# Altium footprint library DipComponent.PcbLib: 303 footprints (part 6 of 19)
Each footprint in its own frame and in the unit in brackets; x right, y up, seen from the top. Pads: shape width x height; smd on the part's side, far side on the other; paste and mask are expansions set on the pad; w line width, h text height; cw(c..) or ccw(c..) is an arc to the next point about the centre after c.
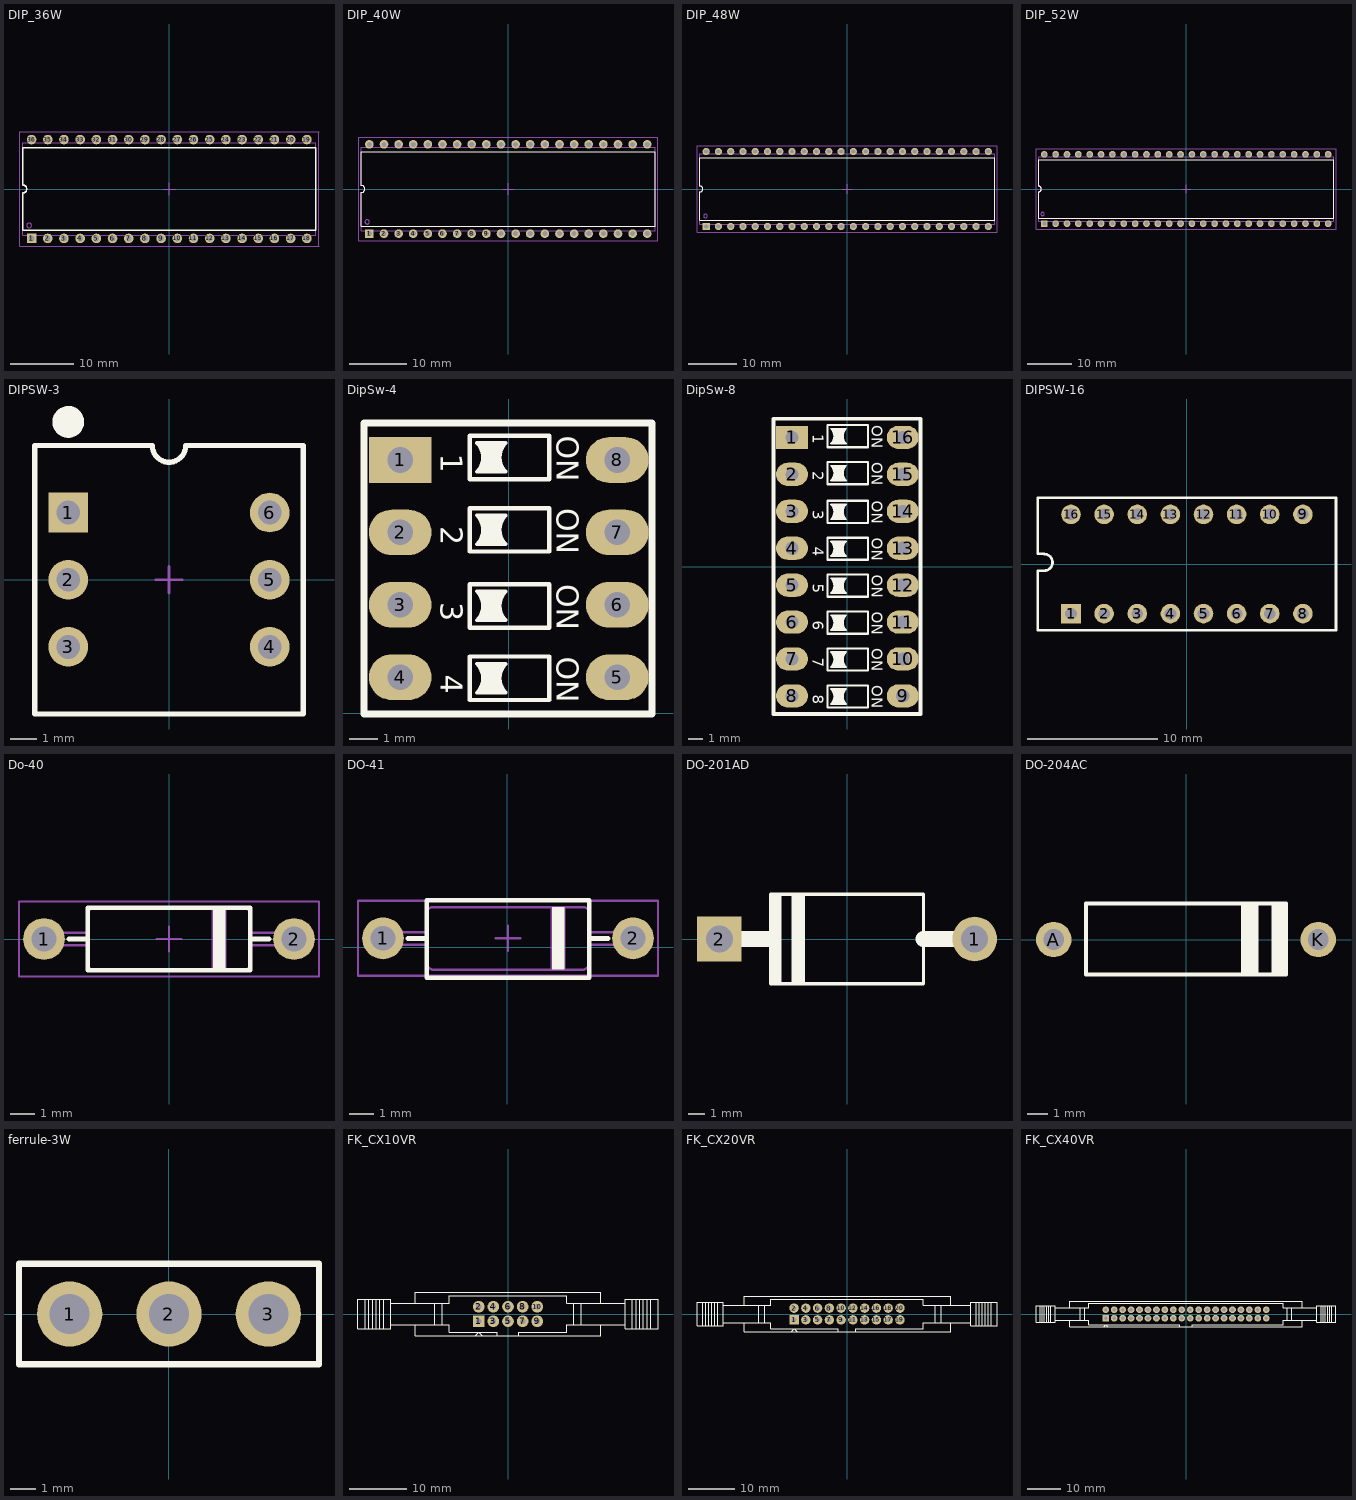
[diagram p5: the footprints below, top view; thin cyan lines are the x and y axes]

## DIP_36W [mm] "Dual-In-line Package,600mil body;36 pin"
height 5.06
pads (36):
  rect 1.5x1.5 hole 0.9: 1(-21.59,-7.75)
  round 1.5 hole 0.9: 2(-19.05,-7.75) 3(-16.51,-7.75) 4(-13.97,-7.75) 5(-11.43,-7.75) 6(-8.89,-7.75) 7(-6.35,-7.75) 8(-3.81,-7.75) 9(-1.27,-7.75) 10(1.27,-7.75) 11(3.81,-7.75) 12(6.35,-7.75) 13(8.89,-7.75) 14(11.43,-7.75) 15(13.97,-7.75) 16(16.51,-7.75) 17(19.05,-7.75) 18(21.59,-7.75) 19(21.59,7.75) 20(19.05,7.75) 21(16.51,7.75) 22(13.97,7.75) 23(11.43,7.75) 24(8.89,7.75) 25(6.35,7.75) 26(3.81,7.75) 27(1.27,7.75) 28(-1.27,7.75) 29(-3.81,7.75) 30(-6.35,7.75) 31(-8.89,7.75) 32(-11.43,7.75) 33(-13.97,7.75) 34(-16.51,7.75) 35(-19.05,7.75) 36(-21.59,7.75)
Top Overlay:
  lines w0.2: -22.96,-6.5 -22.96,-0.6 ccw(c-22.96,0) -22.96,0.6 -22.96,6.5 22.96,6.5 22.96,-6.5 -22.96,-6.5
Mechanical 13:
  circle w0.1: c-21.971,-5.718 r0.381
  lines w0.1: -22.96,-7.25 22.96,-7.25 22.96,7.25 -22.96,7.25 -22.96,0.6 cw(c-22.96,0) -22.96,-0.6 -22.96,-7.25
Mechanical 15:
  lines w0.1: -1,0 1,0 ; 0,-1 0,1 ; 23.46,-9 23.46,9 ; 23.495,-9 -23.46,-9 -23.46,9 23.495,9
3D body: height 5.06, standoff 0, extent -22.96,-7.25 22.96,7.25

## DIP_40W [mm] "Dual-In-line Package,600mil body;40 pin"
height 5.06
pads (40):
  rect 1.5x1.5 hole 0.9: 1(-24.13,-7.75)
  round 1.5 hole 0.9: 2(-21.59,-7.75) 3(-19.05,-7.75) 4(-16.51,-7.75) 5(-13.97,-7.75) 6(-11.43,-7.75) 7(-8.89,-7.75) 8(-6.35,-7.75) 9(-3.81,-7.75) 10(-1.27,-7.75) 11(1.27,-7.75) 12(3.81,-7.75) 13(6.35,-7.75) 14(8.89,-7.75) 15(11.43,-7.75) 16(13.97,-7.75) 17(16.51,-7.75) 18(19.05,-7.75) 19(21.59,-7.75) 20(24.13,-7.75) 21(24.13,7.75) 22(21.59,7.75) 23(19.05,7.75) 24(16.51,7.75) 25(13.97,7.75) 26(11.43,7.75) 27(8.89,7.75) 28(6.35,7.75) 29(3.81,7.75) 30(1.27,7.75) 31(-1.27,7.75) 32(-3.81,7.75) 33(-6.35,7.75) 34(-8.89,7.75) 35(-11.43,7.75) 36(-13.97,7.75) 37(-16.51,7.75) 38(-19.05,7.75) 39(-21.59,7.75) 40(-24.13,7.75)
Top Overlay:
  lines w0.2: -25.5,-6.5 -25.5,-0.6 ccw(c-25.5,0) -25.5,0.6 -25.5,6.5 25.5,6.5 25.5,-6.5 -25.5,-6.5
Mechanical 13:
  circle w0.1: c-24.511,-5.718 r0.381
  lines w0.1: -25.5,-7.25 25.5,-7.25 25.5,7.25 -25.5,7.25 -25.5,0.6 cw(c-25.5,0) -25.5,-0.6 -25.5,-7.25
Mechanical 15:
  lines w0.1: -1,0 1,0 ; 0,-1 0,1 ; -26,-9 26,-9 26,9 -26,9 -26,-9
3D body: height 5.06, standoff 0, extent -25.5,-7.25 25.5,7.25

## DIP_48W [mm] "Dual-In-line Package,600mil body;48 pin"
height 5.06
pads (48):
  rect 1.5x1.5 hole 0.9: 1(-29.21,-7.75)
  round 1.5 hole 0.9: 2(-26.67,-7.75) 3(-24.13,-7.75) 4(-21.59,-7.75) 5(-19.05,-7.75) 6(-16.51,-7.75) 7(-13.97,-7.75) 8(-11.43,-7.75) 9(-8.89,-7.75) 10(-6.35,-7.75) 11(-3.81,-7.75) 12(-1.27,-7.75) 13(1.27,-7.75) 14(3.81,-7.75) 15(6.35,-7.75) 16(8.89,-7.75) 17(11.43,-7.75) 18(13.97,-7.75) 19(16.51,-7.75) 20(19.05,-7.75) 21(21.59,-7.75) 22(24.13,-7.75) 23(26.67,-7.75) 24(29.21,-7.75) 25(29.21,7.75) 26(26.67,7.75) 27(24.13,7.75) 28(21.59,7.75) 29(19.05,7.75) 30(16.51,7.75) 31(13.97,7.75) 32(11.43,7.75) 33(8.89,7.75) 34(6.35,7.75) 35(3.81,7.75) 36(1.27,7.75) 37(-1.27,7.75) 38(-3.81,7.75) 39(-6.35,7.75) 40(-8.89,7.75) 41(-11.43,7.75) 42(-13.97,7.75) 43(-16.51,7.75) 44(-19.05,7.75) 45(-21.59,7.75) 46(-24.13,7.75) 47(-26.67,7.75) 48(-29.21,7.75)
Top Overlay:
  lines w0.2: -30.5,-6.5 30.5,-6.5 30.5,6.5 -30.5,6.5 -30.5,0.6 cw(c-30.5,0) -30.5,-0.6 -30.5,-6.5
Mechanical 13:
  circle w0.1: c-29.337,-5.588 r0.381
  lines w0.1: -30.5,-7.25 -30.5,-0.6 ccw(c-30.5,0) -30.5,0.6 -30.5,7.25 30.5,7.25 30.5,-7.25 -30.5,-7.25
Mechanical 15:
  lines w0.1: -1,0 1,0 ; 0,-1 0,1 ; -31,-9 -31,9 31,9 31,-9 -31,-9
3D body: height 5.06, standoff 0, extent -30.5,-7.25 30.5,7.25

## DIP_52W [mm] "Dual-In-line Package,600mil body;52 pin"
height 5.06
pads (52):
  rect 1.5x1.5 hole 0.9: 1(-31.75,-7.75)
  round 1.5 hole 0.9: 2(-29.21,-7.75) 3(-26.67,-7.75) 4(-24.13,-7.75) 5(-21.59,-7.75) 6(-19.05,-7.75) 7(-16.51,-7.75) 8(-13.97,-7.75) 9(-11.43,-7.75) 10(-8.89,-7.75) 11(-6.35,-7.75) 12(-3.81,-7.75) 13(-1.27,-7.75) 14(1.27,-7.75) 15(3.81,-7.75) 16(6.35,-7.75) 17(8.89,-7.75) 18(11.43,-7.75) 19(13.97,-7.75) 20(16.51,-7.75) 21(19.05,-7.75) 22(21.59,-7.75) 23(24.13,-7.75) 24(26.67,-7.75) 25(29.21,-7.75) 26(31.75,-7.75) 27(31.75,7.75) 28(29.21,7.75) 29(26.67,7.75) 30(24.13,7.75) 31(21.59,7.75) 32(19.05,7.75) 33(16.51,7.75) 34(13.97,7.75) 35(11.43,7.75) 36(8.89,7.75) 37(6.35,7.75) 38(3.81,7.75) 39(1.27,7.75) 40(-1.27,7.75) 41(-3.81,7.75) 42(-6.35,7.75) 43(-8.89,7.75) 44(-11.43,7.75) 45(-13.97,7.75) 46(-16.51,7.75) 47(-19.05,7.75) 48(-21.59,7.75) 49(-24.13,7.75) 50(-26.67,7.75) 51(-29.21,7.75) 52(-31.75,7.75)
Top Overlay:
  lines w0.2: -33,-6.5 -33,-0.6 ccw(c-33,0) -33,0.6 -33,6.5 33,6.5 33,-6.5 -33,-6.5
Mechanical 13:
  circle w0.1: c-32.131,-5.591 r0.381
  lines w0.1: -33,-7.25 33,-7.25 33,7.25 -33,7.25 -33,0.6 cw(c-33,0) -33,-0.6 -33,-7.25
Mechanical 15:
  lines w0.1: -1,0 1,0 ; 0,-1 0,1 ; -33.5,-9 33.5,-9 33.5,9 -33.5,9 -33.5,-9
3D body: height 5.06, standoff 0, extent -33,-7.25 33,7.25

## DIPSW-3 [mm] "DIP; 6 Leads; Row Spacing 7.62 mm; Pitch 2.54 mm"
height 5.46
pads (6):
  rect 1.5x1.5 hole 0.9: 1(-3.81,2.54)
  round 1.5 hole 0.9: 2(-3.81,0) 3(-3.81,-2.54) 4(3.81,-2.54) 5(3.81,0) 6(3.81,2.54)
Top Overlay:
  circle w0.6: c-3.81,5.969 r0.3
  lines w0.2: -5.08,-5.08 -5.08,5.08 -0.635,5.08 ccw(c0,5.08) 0.635,5.08 5.08,5.08 5.08,-5.08 -5.08,-5.08
Mechanical 15:
  lines w0.1: -0.5,0 0.5,0 ; 0,-0.5 0,0.5
3D body "dipsw3.step": height 8.5, standoff -3.8, extent -4.89,-4.94 4.89,4.94

## DipSw-4 [mm]
height 5
pads (8):
  rect 2.2x1.6 hole 0.9: 1(-3.81,8.89)
  oval 2.2x1.6 hole 0.9: 2(-3.81,6.35) 3(-3.81,3.81) 4(-3.81,1.27) 5(3.81,1.27) 6(3.81,3.81) 7(3.81,6.35) 8(3.81,8.89)
Top Overlay:
  lines w0.127: -0.635,1.003 -0.584,1.334 -0.66,1.435 -0.483,1.435 -0.584,1.156 -0.483,0.978 -0.737,0.978 -0.635,1.232 -0.762,1.511 -0.381,1.511 -0.508,1.206 -0.356,0.902 -0.864,0.902 -0.711,1.283 -0.889,1.587 -0.279,1.587 -0.406,1.206 -0.254,0.8 -0.965,0.8 -0.813,1.308 -0.991,1.664 -0.203,1.664 ; -0.635,3.543 -0.584,3.873 -0.66,3.975 -0.483,3.975 -0.584,3.696 -0.483,3.518 -0.737,3.518 -0.635,3.772 -0.762,4.051 -0.381,4.051 -0.508,3.746 -0.356,3.442 -0.864,3.442 -0.711,3.823 -0.889,4.127 -0.279,4.127 -0.406,3.746 -0.254,3.34 -0.965,3.34 -0.813,3.848 -0.991,4.204 -0.203,4.204 ; -0.635,6.21 -0.584,6.54 -0.66,6.642 -0.483,6.642 -0.584,6.363 -0.483,6.185 -0.737,6.185 -0.635,6.439 -0.762,6.718 -0.381,6.718 -0.508,6.413 -0.356,6.109 -0.864,6.109 -0.711,6.49 -0.889,6.794 -0.279,6.794 -0.406,6.414 -0.254,6.007 -0.965,6.007 -0.813,6.515 -0.991,6.871 -0.203,6.871 ; -0.635,8.75 -0.584,9.08 -0.66,9.182 -0.483,9.182 -0.584,8.903 -0.483,8.725 -0.737,8.725 -0.635,8.979 -0.762,9.258 -0.381,9.258 -0.508,8.954 -0.356,8.649 -0.864,8.649 -0.711,9.03 -0.889,9.335 -0.279,9.335 -0.406,8.953 -0.254,8.547 -0.965,8.547 -0.813,9.055 -0.991,9.411 -0.203,9.411 ; -1.118,0.724 ccw(c-1.626,1.232) -1.118,1.74 -0.102,1.74 ccw(c0.406,1.232) -0.102,0.724 -1.118,0.724 ; -1.118,3.264 ccw(c-1.626,3.772) -1.118,4.28 -0.102,4.28 ccw(c0.406,3.772) -0.102,3.264 -1.118,3.264 ; -1.118,5.931 ccw(c-1.626,6.439) -1.118,6.947 -0.102,6.947 ccw(c0.406,6.439) -0.102,5.931 -1.118,5.931 ; -1.118,8.471 ccw(c-1.626,8.979) -1.118,9.487 -0.102,9.487 ccw(c0.406,8.979) -0.102,8.471 -1.118,8.471
  lines w0.152: -1.371,0.47 -1.371,1.994 1.421,1.994 1.421,0.47 -1.371,0.47 ; -1.371,3.01 -1.371,4.534 1.421,4.534 1.421,3.01 -1.371,3.01 ; -1.371,5.677 -1.371,7.201 1.421,7.201 1.421,5.677 -1.371,5.677 ; -1.371,8.217 -1.371,9.741 1.421,9.741 1.421,8.217 -1.371,8.217
  lines w0.254: -5.08,-0.022 -5.08,10.185 5.029,10.185 5.029,-0.022 -5.08,-0.022
  text "ON" at 1.676,9.741 h0.76
  text "1" at -2.388,9.106 h0.76
  text "ON" at 1.676,7.201 h0.76
  text "2" at -2.388,6.566 h0.76
  text "ON" at 1.676,4.534 h0.76
  text "3" at -2.388,3.899 h0.76
  text "ON" at 1.676,1.994 h0.76
  text "4" at -2.388,1.359 h0.76
3D body: height 4, standoff 0, extent -5.087,0.005 5.033,10.184

## DipSw-8 [mm]
height 5
pads (16):
  rect 2.2x1.6 hole 0.9: 1(-3.81,8.89)
  oval 2.2x1.6 hole 0.9: 2(-3.81,6.35) 3(-3.81,3.81) 4(-3.81,1.27) 5(-3.81,-1.27) 6(-3.81,-3.81) 7(-3.81,-6.35) 8(-3.81,-8.89) 9(3.81,-8.89) 10(3.81,-6.35) 11(3.81,-3.81) 12(3.81,-1.27) 13(3.81,1.27) 14(3.81,3.81) 15(3.81,6.35) 16(3.81,8.89)
Top Overlay:
  drawing of 236 lines, arcs and shapes, not listed
  text "ON" at 1.676,9.741 h0.76
  text "1" at -2.388,9.106 h0.76
  text "ON" at 1.676,7.201 h0.76
  text "2" at -2.388,6.566 h0.76
  text "ON" at 1.676,4.534 h0.76
  text "3" at -2.388,3.899 h0.76
  text "ON" at 1.676,1.994 h0.76
  text "4" at -2.388,1.359 h0.76
  text "ON" at 1.676,-0.546 h0.76
  text "5" at -2.388,-1.181 h0.76
  text "ON" at 1.676,-3.086 h0.76
  text "6" at -2.388,-3.721 h0.76
  text "ON" at 1.676,-5.626 h0.76
  text "7" at -2.388,-6.261 h0.76
  text "ON" at 1.676,-8.166 h0.76
  text "8" at -2.388,-8.801 h0.76
3D body: height 4, standoff 0, extent -5.08,-10.135 5.029,10.185

## DIPSW-16 [mm] "DIP; 16 Leads; Row Spacing 7.62 mm; Pitch 2.54 mm"
pads (16):
  rect 1.5x1.5 hole 0.9: 1(-8.89,-3.81)
  round 1.5 hole 0.9: 2(-6.35,-3.81) 3(-3.81,-3.81) 4(-1.27,-3.81) 5(1.27,-3.81) 6(3.81,-3.81) 7(6.35,-3.81) 8(8.89,-3.81) 9(8.89,3.81) 10(6.35,3.81) 11(3.81,3.81) 12(1.27,3.81) 13(-1.27,3.81) 14(-3.81,3.81) 15(-6.35,3.81) 16(-8.89,3.81)
Top Overlay:
  lines w0.2: -10.94,0.76 cw(c-10.94,0.125) -10.94,-0.51 -11.43,-0.51 -11.43,-5.08 11.43,-5.08 11.43,5.08 -11.43,5.08 -11.43,0.79 -10.94,0.79
3D body "User Library-DIP SWITCH 8 POS CTS 206.step": height 8.25, standoff -3.5, extent -11.25,-4.89 11.25,4.89

## Do-40 [mm] "Diode, Axial; Body 6.1 x 2mm ,Pitch 10.16mm"
height 2.54
pads (2):
  round 1.7 hole 1: 1(-5.08,0) 2(5.08,0)
Top Overlay:
  rectangle: 1.778,-1.27 2.286,1.27
  lines w0.2: -4.064,0 -3.302,0 ; 3.302,0 4.064,0 ; -3.302,-1.27 3.302,-1.27 3.302,1.27 -3.302,1.27 -3.302,-1.27
Mechanical 13:
  lines w0.1: -5.207,-0.254 cw(c-5.207,-0.127) -5.334,-0.127 -5.334,0.127 cw(c-5.207,0.127) -5.207,0.254 ; -5.197,-0.254 -4.953,-0.254 ; -5.197,0.254 -4.953,0.254 ; -3.304,-0.254 -4.953,-0.254 ; -3.304,0.254 -4.953,0.254 ; 1.778,-1.27 1.778,1.27 ; 2.286,-1.27 2.286,1.27 ; 3.304,-0.254 4.953,-0.254 ; 3.304,0.254 4.953,0.254 ; 5.197,-0.254 4.953,-0.254 ; 5.197,0.254 4.953,0.254 ; 5.207,-0.254 ccw(c5.207,-0.127) 5.334,-0.127 5.334,0.127 ccw(c5.207,0.127) 5.207,0.254 ; -4.953,-0.254 -4.953,0.254 ; 4.953,-0.254 4.953,0.254 ; -3.302,-1.016 ccw(c-3.048,-1.016) -3.048,-1.27 3.048,-1.27 ccw(c3.048,-1.016) 3.302,-1.016 3.302,1.016 ccw(c3.048,1.016) 3.048,1.27 -3.048,1.27 ccw(c-3.048,1.016) -3.302,1.016 -3.302,-1.016
Mechanical 15:
  lines w0.1: -0.508,0 0,0 ; 0,-0.508 0,0 ; 0,0.508 0,0 ; 0.508,0 0,0 ; -6.096,-1.524 -6.096,1.524 6.096,1.524 6.096,-1.524 -6.096,-1.524
3D body: height 1.1, standoff 0.9, extent 3.304,-0.254 4.953,0.254
3D body: height 1.1, standoff 0, extent 4.953,-0.254 5.334,0.254
3D body: height 1.1, standoff 0, extent -5.334,-0.254 -4.953,0.254
3D body: height 1.1, standoff 0.9, extent -4.953,-0.254 -3.304,0.254
3D body: height 2.54, standoff 0, extent 2.286,-1.27 3.302,1.27
3D body: height 2.54, standoff 0, extent -3.302,-1.27 1.779,1.27
3D body: height 2.54, standoff 0, extent 1.779,-1.269 2.285,1.269

## DO-41 [mm]
pads (2):
  round 1.7 hole 1: 1(-5.055,0.356) 2(5.105,0.356)
Top Overlay:
  rectangle: 1.803,-0.914 2.311,1.626
  lines w0.2: -4.039,0.356 -3.277,0.356 ; 3.327,0.356 4.089,0.356 ; -3.277,-1.245 3.327,-1.245 3.327,1.905 -3.277,1.905 -3.277,-1.245
Mechanical 13:
  lines w0.1: -5.182,0.102 cw(c-5.182,0.229) -5.309,0.229 -5.309,0.483 cw(c-5.182,0.483) -5.182,0.61 ; -5.171,0.102 -4.928,0.102 ; -5.171,0.61 -4.928,0.61 ; -3.279,0.102 -4.928,0.102 ; -3.279,0.61 -4.928,0.61 ; 1.803,-0.914 1.803,1.626 ; 2.311,-0.914 2.311,1.626 ; 3.33,0.102 4.978,0.102 ; 3.33,0.61 4.978,0.61 ; 5.222,0.102 4.978,0.102 ; 5.222,0.61 4.978,0.61 ; 5.232,0.102 ccw(c5.232,0.229) 5.359,0.229 5.359,0.483 ccw(c5.232,0.483) 5.232,0.61 ; -4.928,0.102 -4.928,0.61 ; 4.978,0.102 4.978,0.61 ; -3.277,-0.66 ccw(c-3.023,-0.66) -3.023,-0.914 3.073,-0.914 ccw(c3.073,-0.66) 3.327,-0.66 3.327,1.372 ccw(c3.073,1.372) 3.073,1.626 -3.023,1.626 ccw(c-3.023,1.372) -3.277,1.372 -3.277,-0.66
Mechanical 15:
  lines w0.1: -0.483,0.356 0.025,0.356 ; 0.025,-0.152 0.025,0.356 ; 0.025,0.864 0.025,0.356 ; 0.533,0.356 0.025,0.356 ; -6.071,-1.168 -6.071,1.88 6.121,1.88 6.121,-1.168 -6.071,-1.168
3D body "DO-41.STEP": height 3.35, standoff -2, extent -5.586,-0.991 5.434,1.709

## DO-201AD [mm] "1N5408"
height 5
pads (2):
  round 2.8 hole 1.7: 1(8,0)
  rect 2.8x2.8 hole 1.7: 2(-8,0)
Top Overlay:
  region: -4.1,2.8 -4.9,2.8 -4.9,-2.8 -4.1,-2.8
  region: -2.631,-2.8 -2.631,2.86 -3.484,2.86 -3.484,-2.8
  lines w0.2: -4.8,-2.8 4.8,-2.8 4.8,2.8 -4.8,2.8
  lines w0.254: -2.995,-2.735 -2.985,-2.746
  lines w1: -8,0 -4.699,0 ; 4.8,0 8.101,0
3D body "User Library-Diode 1N5408 (pcb).STEP": height 6.51, standoff -1.85, extent -7.168,-2.548 6.732,2.474

## DO-204AC [mm] "DO-15"
pads (2):
  round 1.7 hole 1: A(-6.35,0) K(6.35,0)
Top Overlay:
  region: 2.631,1.753 2.631,-1.626 3.484,-1.626 3.484,1.753
  rectangle: 4.1,-1.676 4.9,1.727
  lines w0.2: 4.8,-1.676 -4.8,-1.676 -4.8,1.727 4.8,1.727
3D body "DO-15-50.step": height 3.53, standoff -2, extent -6.901,-1.741 6.849,1.747

## ferrule-3W [mm]
pads (3):
  round 2.6 hole 1.6: 1(-3.96,0) 2(0,0) 3(3.96,0)
Top Overlay:
  lines w0.254: -5.98,-2 -5.98,2 5.98,2 5.98,-2 -5.98,-2
3D body "ferrule1.step": height 12.3, standoff -2.3, extent -5.702,-1.75 -2.217,1.75
3D body "ferrule1.step": height 12.3, standoff -2.3, extent -1.742,-1.75 1.743,1.75
3D body "ferrule1.step": height 12.3, standoff -2.3, extent 2.218,-1.75 5.703,1.75

## FK_CX10VR [mil]
pads (10):
  rect 80x80 hole 39.37: 1(-200,-50)
  round 80 hole 39.37: 2(-200,50) 3(-100,-50) 4(-100,50) 5(0,-50) 6(0,50) 7(100,-50) 8(100,50) 9(200,-50) 10(200,50)
Top Overlay:
  lines w8: -975,-100 -975,100 ; -950,-100 -950,100 ; -925,-100 -925,100 ; -900,-100 -900,100 ; -875,-100 -875,100 ; -850,-100 -850,100 ; -800,-75 -633.33,-75 ; -800,75 -633.33,75 ; -500,-75 -500,75 ; -450,-75 -450,75 ; -225,-150 -200,-125 -175,-150 ; -75,-150 -75,-125 -400,-125 -400,-75 -633.33,-75 ; 75,-150 75,-125 400,-125 400,-75 633.33,-75 ; 450,-75 450,75 ; 500,-75 500,75 ; 800,-75 633.33,-75 ; 800,75 633.33,75 ; 850,-100 850,100 ; 875,-100 875,100 ; 900,-100 900,100 ; 925,-100 925,100 ; 950,-100 950,100 ; 975,-100 975,100 ; -633.33,-75 -633.33,-150 633.33,-150 633.33,-75 ; -633.33,75 -633.33,150 633.33,150 633.33,75 ; -633.33,75 -400,75 -400,125 400,125 400,75 633.33,75 ; -1025,-100 -800,-100 -800,100 -1025,100 -1025,-100 ; 800,-100 1025,-100 1025,100 800,100 800,-100

## FK_CX20VR [mil]
pads (20):
  rect 80x80 hole 39.37: 1(-450,-50)
  round 80 hole 39.37: 2(-450,50) 3(-350,-50) 4(-350,50) 5(-250,-50) 6(-250,50) 7(-150,-50) 8(-150,50) 9(-50,-50) 10(-50,50) 11(50,-50) 12(50,50) 13(150,-50) 14(150,50) 15(250,-50) 16(250,50) 17(350,-50) 18(350,50) 19(450,-50) 20(450,50)
Top Overlay:
  lines w8: -1225,-100 -1225,100 ; -1200,-100 -1200,100 ; -1175,-100 -1175,100 ; -1150,-100 -1150,100 ; -1125,-100 -1125,100 ; -1100,-100 -1100,100 ; -1050,-75 -650,-75 -650,-125 -75,-125 -75,-150 ; -1050,75 -650,75 -650,125 650,125 650,75 1050,75 ; -875,-75 -875,-150 883.33,-150 883.33,-75 ; -875,75 -875,150 883.33,150 883.33,75 ; -750,-75 -750,75 ; -700,-75 -700,75 ; -475,-150 -450,-125 -425,-150 ; 75,-150 75,-125 650,-125 650,-75 1050,-75 ; 750,-75 750,75 ; 800,-75 800,75 ; 1100,-100 1100,100 ; 1125,-100 1125,100 ; 1150,-100 1150,100 ; 1175,-100 1175,100 ; 1200,-100 1200,100 ; 1225,-100 1225,100 ; -1275,-100 -1275,100 -1050,100 -1050,-100 -1275,-100 ; 1050,-100 1050,100 1275,100 1275,-100 1050,-100

## FK_CX40VR [mil]
pads (40):
  rect 80x80 hole 43.31: 1(-950,-50)
  round 80 hole 43.31: 2(-950,50) 3(-850,-50) 4(-850,50) 5(-750,-50) 6(-750,50) 7(-650,-50) 8(-650,50) 9(-550,-50) 10(-550,50) 11(-450,-50) 12(-450,50) 13(-350,-50) 14(-350,50) 15(-250,-50) 16(-250,50) 17(-150,-50) 18(-150,50) 19(-50,-50) 20(-50,50) 21(50,-50) 22(50,50) 23(150,-50) 24(150,50) 25(250,-50) 26(250,50) 27(350,-50) 28(350,50) 29(450,-50) 30(450,50) 31(550,-50) 32(550,50) 33(650,-50) 34(650,50) 35(750,-50) 36(750,50) 37(850,-50) 38(850,50) 39(950,-50) 40(950,50)
Top Overlay:
  lines w8: -1725,-100 -1725,100 ; -1700,-100 -1700,100 ; -1675,-100 -1675,100 ; -1650,-100 -1650,100 ; -1625,-100 -1625,100 ; -1600,-100 -1600,100 ; -1550,-75 -1150,-75 -1150,-125 -75,-125 -75,-150 ; -1550,75 -1150,75 -1150,125 1150,125 1150,75 1550,75 ; -1375,-75 -1375,-150 1375,-150 1375,-75 ; -1375,75 -1375,150 1375,150 1375,75 ; -1250,-75 -1250,75 ; -1200,-75 -1200,75 ; -975,-150 -950,-125 -925,-150 ; 75,-150 75,-125 1150,-125 1150,-75 1550,-75 ; 1200,-75 1200,75 ; 1250,-75 1250,75 ; 1600,-100 1600,100 ; 1625,-100 1625,100 ; 1650,-100 1650,100 ; 1675,-100 1675,100 ; 1700,-100 1700,100 ; 1725,-100 1725,100 ; -1775,-100 -1775,100 -1550,100 -1550,-100 -1775,-100 ; 1550,-100 1550,100 1775,100 1775,-100 1550,-100